# Altium integrated library Weidmueller_OMNIMATE_Power.IntLib: 508 symbols (part 8 of 9)
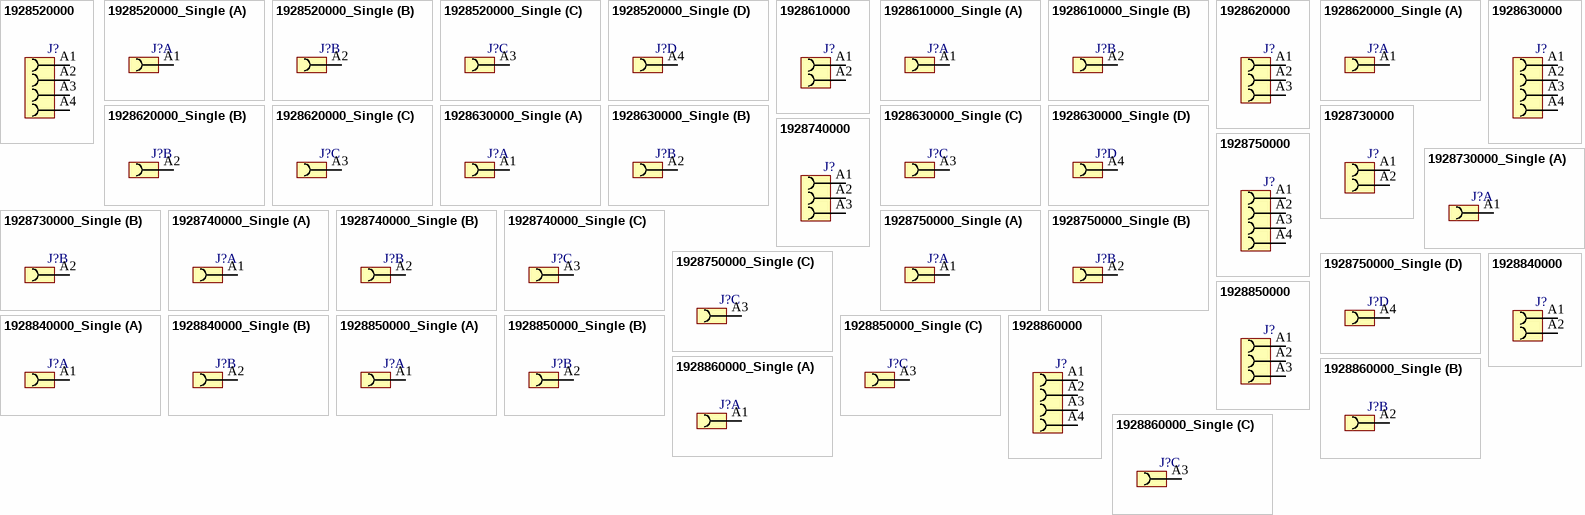
[diagram p38: symbols 1928520000 to 1928860000_Single]

## 1928740000_Single
designator J?
OMNIMATE Power - series BV/SV 7.62HP; PartNumber: 1928740000; Manufacturer: Weidmueller; Short_text_for_material: BVL 7.62HP/03/180FI 3.5SN BK BX; Side_termination_characteristic: Clip-on flange, inverted; Mounting_onto_the_PCB: Solder connection; Pitch_mm: 7.62 mm; Pitch_inch: 0.3 inch; No_of_poles: 3; Outgoing_elbow: 180°; Solder_pin_length_mm: 3.5 mm; Contact_material: Cu-Leg; Contact_surface: tinned; Insulating_material: PA GF; UL_94_flammability_rating: V-0; Rated_voltage_for_surge_voltage_class_pollution_degree_II_2: 1000 V; Rated_voltage_use_group_B_UL_1059: 300 V; Rated_current_use_group_B_UL_1059: 35 A; PackageReference: BVL_7_62HP_180FI_03; Colour: Black; Packaging: Box; Qty: 100 PCS; Revision: V1; ComponentLink1Description: Manufacturer URL; ComponentLink1URL: http://www.weidmueller.com/; ComponentLink2Description: URL Link1; ComponentLink2URL: http://catalog.weidmueller.com/catalog/Start.do?localeId=en&ObjectID=1928740000
footprint BVL_7_62HP_180FI_03 (OMNIMATE Power - Serie BV/SV 7.62HP  BVL 7.62HP/03/180FI 3.5)
part A pins: A1
part B pins: A2
part C pins: A3

## 1928750000
designator J?
OMNIMATE Power - series BV/SV 7.62HP; PartNumber: 1928750000; Manufacturer: Weidmueller; Short_text_for_material: BVL 7.62HP/04/180FI 3.5SN BK BX; Side_termination_characteristic: Clip-on flange, inverted; Mounting_onto_the_PCB: Solder connection; Pitch_mm: 7.62 mm; Pitch_inch: 0.3 inch; No_of_poles: 4; Outgoing_elbow: 180°; Solder_pin_length_mm: 3.5 mm; Contact_material: Cu-Leg; Contact_surface: tinned; Insulating_material: PA GF; UL_94_flammability_rating: V-0; Rated_voltage_for_surge_voltage_class_pollution_degree_II_2: 1000 V; Rated_voltage_use_group_B_UL_1059: 300 V; Rated_current_use_group_B_UL_1059: 35 A; PackageReference: BVL_7_62HP_180FI_04; Colour: Black; Packaging: Box; Qty: 100 PCS; Revision: V1; ComponentLink1Description: Manufacturer URL; ComponentLink1URL: http://www.weidmueller.com/; ComponentLink2Description: URL Link1; ComponentLink2URL: http://catalog.weidmueller.com/catalog/Start.do?localeId=en&ObjectID=1928750000
footprint BVL_7_62HP_180FI_04 (OMNIMATE Power - Serie BV/SV 7.62HP  BVL 7.62HP/04/180FI 3.5)
pins: A1, A2, A3, A4

## 1928750000_Single
designator J?
OMNIMATE Power - series BV/SV 7.62HP; PartNumber: 1928750000; Manufacturer: Weidmueller; Short_text_for_material: BVL 7.62HP/04/180FI 3.5SN BK BX; Side_termination_characteristic: Clip-on flange, inverted; Mounting_onto_the_PCB: Solder connection; Pitch_mm: 7.62 mm; Pitch_inch: 0.3 inch; No_of_poles: 4; Outgoing_elbow: 180°; Solder_pin_length_mm: 3.5 mm; Contact_material: Cu-Leg; Contact_surface: tinned; Insulating_material: PA GF; UL_94_flammability_rating: V-0; Rated_voltage_for_surge_voltage_class_pollution_degree_II_2: 1000 V; Rated_voltage_use_group_B_UL_1059: 300 V; Rated_current_use_group_B_UL_1059: 35 A; PackageReference: BVL_7_62HP_180FI_04; Colour: Black; Packaging: Box; Qty: 100 PCS; Revision: V1; ComponentLink1Description: Manufacturer URL; ComponentLink1URL: http://www.weidmueller.com/; ComponentLink2Description: URL Link1; ComponentLink2URL: http://catalog.weidmueller.com/catalog/Start.do?localeId=en&ObjectID=1928750000
footprint BVL_7_62HP_180FI_04 (OMNIMATE Power - Serie BV/SV 7.62HP  BVL 7.62HP/04/180FI 3.5)
part A pins: A1
part B pins: A2
part C pins: A3
part D pins: A4

## 1928840000
designator J?
OMNIMATE Power - series BV/SV 7.62HP; PartNumber: 1928840000; Manufacturer: Weidmueller; Short_text_for_material: BVL 7.62HP/02/180SFI 3.5SN BK BX; Side_termination_characteristic: Screw/clip-on flange, reversed; Mounting_onto_the_PCB: Solder connection; Pitch_mm: 7.62 mm; Pitch_inch: 0.3 inch; No_of_poles: 2; Outgoing_elbow: 180°; Solder_pin_length_mm: 3.5 mm; Contact_material: Cu-Leg; Contact_surface: tinned; Insulating_material: PA GF; UL_94_flammability_rating: V-0; Rated_voltage_for_surge_voltage_class_pollution_degree_II_2: 1000 V; Rated_voltage_use_group_B_UL_1059: 300 V; Rated_current_use_group_B_UL_1059: 35 A; PackageReference: BVL_7_62HP_180SFI_02; Colour: Black; Packaging: Box; Qty: 100 PCS; Revision: V1; ComponentLink1Description: Manufacturer URL; ComponentLink1URL: http://www.weidmueller.com/; ComponentLink2Description: URL Link1; ComponentLink2URL: http://catalog.weidmueller.com/catalog/Start.do?localeId=en&ObjectID=1928840000
footprint BVL_7_62HP_180SFI_02 (OMNIMATE Power - Serie BV/SV 7.62HP  BVL 7.62HP/02/180SFI 3.5)
pins: A1, A2

## 1928840000_Single
designator J?
OMNIMATE Power - series BV/SV 7.62HP; PartNumber: 1928840000; Manufacturer: Weidmueller; Short_text_for_material: BVL 7.62HP/02/180SFI 3.5SN BK BX; Side_termination_characteristic: Screw/clip-on flange, reversed; Mounting_onto_the_PCB: Solder connection; Pitch_mm: 7.62 mm; Pitch_inch: 0.3 inch; No_of_poles: 2; Outgoing_elbow: 180°; Solder_pin_length_mm: 3.5 mm; Contact_material: Cu-Leg; Contact_surface: tinned; Insulating_material: PA GF; UL_94_flammability_rating: V-0; Rated_voltage_for_surge_voltage_class_pollution_degree_II_2: 1000 V; Rated_voltage_use_group_B_UL_1059: 300 V; Rated_current_use_group_B_UL_1059: 35 A; PackageReference: BVL_7_62HP_180SFI_02; Colour: Black; Packaging: Box; Qty: 100 PCS; Revision: V1; ComponentLink1Description: Manufacturer URL; ComponentLink1URL: http://www.weidmueller.com/; ComponentLink2Description: URL Link1; ComponentLink2URL: http://catalog.weidmueller.com/catalog/Start.do?localeId=en&ObjectID=1928840000
footprint BVL_7_62HP_180SFI_02 (OMNIMATE Power - Serie BV/SV 7.62HP  BVL 7.62HP/02/180SFI 3.5)
part A pins: A1
part B pins: A2

## 1928850000
designator J?
OMNIMATE Power - series BV/SV 7.62HP; PartNumber: 1928850000; Manufacturer: Weidmueller; Short_text_for_material: BVL 7.62HP/03/180SFI 3.5SN BK BX; Side_termination_characteristic: Screw/clip-on flange, reversed; Mounting_onto_the_PCB: Solder connection; Pitch_mm: 7.62 mm; Pitch_inch: 0.3 inch; No_of_poles: 3; Outgoing_elbow: 180°; Solder_pin_length_mm: 3.5 mm; Contact_material: Cu-Leg; Contact_surface: tinned; Insulating_material: PA GF; UL_94_flammability_rating: V-0; Rated_voltage_for_surge_voltage_class_pollution_degree_II_2: 1000 V; Rated_voltage_use_group_B_UL_1059: 300 V; Rated_current_use_group_B_UL_1059: 35 A; PackageReference: BVL_7_62HP_180SFI_03; Colour: Black; Packaging: Box; Qty: 100 PCS; Revision: V1; ComponentLink1Description: Manufacturer URL; ComponentLink1URL: http://www.weidmueller.com/; ComponentLink2Description: URL Link1; ComponentLink2URL: http://catalog.weidmueller.com/catalog/Start.do?localeId=en&ObjectID=1928850000
footprint BVL_7_62HP_180SFI_03 (OMNIMATE Power - Serie BV/SV 7.62HP  BVL 7.62HP/03/180SFI 3.5)
pins: A1, A2, A3

## 1928850000_Single
designator J?
OMNIMATE Power - series BV/SV 7.62HP; PartNumber: 1928850000; Manufacturer: Weidmueller; Short_text_for_material: BVL 7.62HP/03/180SFI 3.5SN BK BX; Side_termination_characteristic: Screw/clip-on flange, reversed; Mounting_onto_the_PCB: Solder connection; Pitch_mm: 7.62 mm; Pitch_inch: 0.3 inch; No_of_poles: 3; Outgoing_elbow: 180°; Solder_pin_length_mm: 3.5 mm; Contact_material: Cu-Leg; Contact_surface: tinned; Insulating_material: PA GF; UL_94_flammability_rating: V-0; Rated_voltage_for_surge_voltage_class_pollution_degree_II_2: 1000 V; Rated_voltage_use_group_B_UL_1059: 300 V; Rated_current_use_group_B_UL_1059: 35 A; PackageReference: BVL_7_62HP_180SFI_03; Colour: Black; Packaging: Box; Qty: 100 PCS; Revision: V1; ComponentLink1Description: Manufacturer URL; ComponentLink1URL: http://www.weidmueller.com/; ComponentLink2Description: URL Link1; ComponentLink2URL: http://catalog.weidmueller.com/catalog/Start.do?localeId=en&ObjectID=1928850000
footprint BVL_7_62HP_180SFI_03 (OMNIMATE Power - Serie BV/SV 7.62HP  BVL 7.62HP/03/180SFI 3.5)
part A pins: A1
part B pins: A2
part C pins: A3

## 1928860000
designator J?
OMNIMATE Power - series BV/SV 7.62HP; PartNumber: 1928860000; Manufacturer: Weidmueller; Short_text_for_material: BVL 7.62HP/04/180SFI 3.5SN BK BX; Side_termination_characteristic: Screw/clip-on flange, reversed; Mounting_onto_the_PCB: Solder connection; Pitch_mm: 7.62 mm; Pitch_inch: 0.3 inch; No_of_poles: 4; Outgoing_elbow: 180°; Solder_pin_length_mm: 3.5 mm; Contact_material: Cu-Leg; Contact_surface: tinned; Insulating_material: PA GF; UL_94_flammability_rating: V-0; Rated_voltage_for_surge_voltage_class_pollution_degree_II_2: 1000 V; Rated_voltage_use_group_B_UL_1059: 300 V; Rated_current_use_group_B_UL_1059: 35 A; PackageReference: BVL_7_62HP_180SFI_04; Colour: Black; Packaging: Box; Qty: 100 PCS; Revision: V1; ComponentLink1Description: Manufacturer URL; ComponentLink1URL: http://www.weidmueller.com/; ComponentLink2Description: URL Link1; ComponentLink2URL: http://catalog.weidmueller.com/catalog/Start.do?localeId=en&ObjectID=1928860000
footprint BVL_7_62HP_180SFI_04 (OMNIMATE Power - Serie BV/SV 7.62HP  BVL 7.62HP/04/180SFI 3.5)
pins: A1, A2, A3, A4

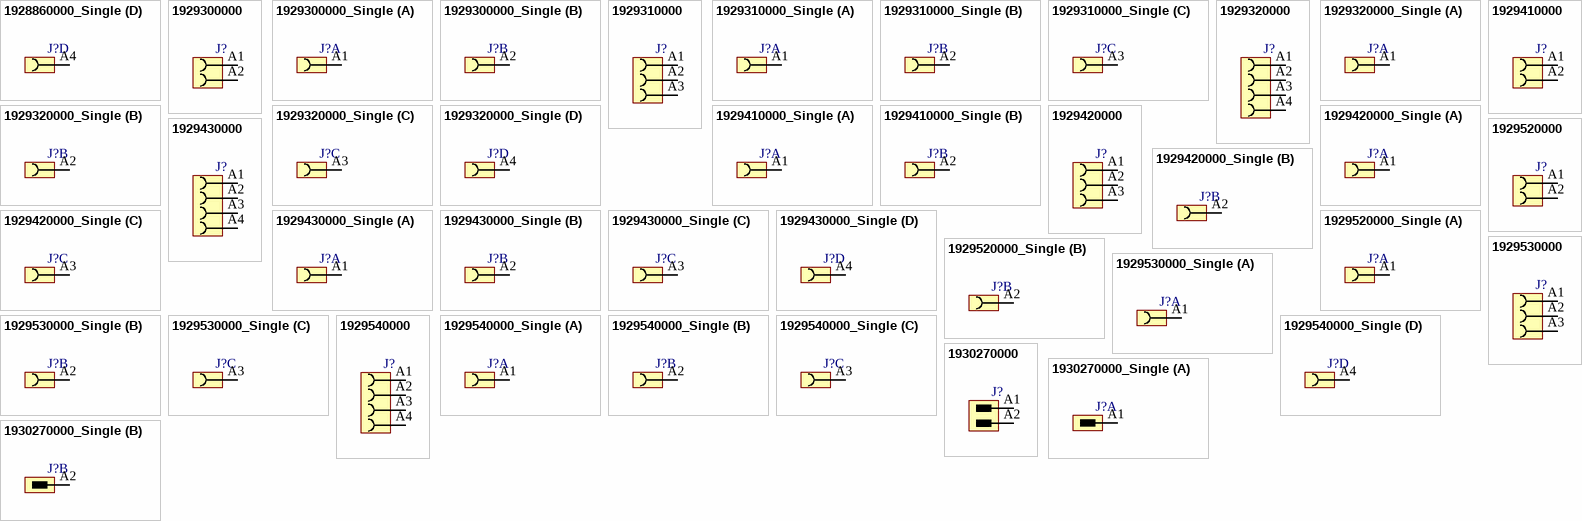
[diagram p27: symbols 1928860000_Single to 1930270000_Single]

## 1928860000_Single
designator J?
OMNIMATE Power - series BV/SV 7.62HP; PartNumber: 1928860000; Manufacturer: Weidmueller; Short_text_for_material: BVL 7.62HP/04/180SFI 3.5SN BK BX; Side_termination_characteristic: Screw/clip-on flange, reversed; Mounting_onto_the_PCB: Solder connection; Pitch_mm: 7.62 mm; Pitch_inch: 0.3 inch; No_of_poles: 4; Outgoing_elbow: 180°; Solder_pin_length_mm: 3.5 mm; Contact_material: Cu-Leg; Contact_surface: tinned; Insulating_material: PA GF; UL_94_flammability_rating: V-0; Rated_voltage_for_surge_voltage_class_pollution_degree_II_2: 1000 V; Rated_voltage_use_group_B_UL_1059: 300 V; Rated_current_use_group_B_UL_1059: 35 A; PackageReference: BVL_7_62HP_180SFI_04; Colour: Black; Packaging: Box; Qty: 100 PCS; Revision: V1; ComponentLink1Description: Manufacturer URL; ComponentLink1URL: http://www.weidmueller.com/; ComponentLink2Description: URL Link1; ComponentLink2URL: http://catalog.weidmueller.com/catalog/Start.do?localeId=en&ObjectID=1928860000
footprint BVL_7_62HP_180SFI_04 (OMNIMATE Power - Serie BV/SV 7.62HP  BVL 7.62HP/04/180SFI 3.5)
part A pins: A1
part B pins: A2
part C pins: A3
part D pins: A4

## 1929300000
designator J?
OMNIMATE Power - series BV/SV 7.62HP; PartNumber: 1929300000; Manufacturer: Weidmueller; Short_text_for_material: BVL 7.62HP/02/270 3.5SN BK BX; Side_termination_characteristic: closed side; Mounting_onto_the_PCB: Solder connection; Pitch_mm: 7.62 mm; Pitch_inch: 0.3 inch; No_of_poles: 2; Outgoing_elbow: 270°; Solder_pin_length_mm: 3.5 mm; Contact_material: Cu-Leg; Contact_surface: tinned; Insulating_material: PA GF; UL_94_flammability_rating: V-0; Rated_voltage_for_surge_voltage_class_pollution_degree_II_2: 1000 V; Rated_voltage_use_group_B_UL_1059: 300 V; Rated_current_use_group_B_UL_1059: 35 A; PackageReference: BVL_7_62HP_270_02; Colour: Black; Packaging: Box; Qty: 100 PCS; Revision: V1; ComponentLink1Description: Manufacturer URL; ComponentLink1URL: http://www.weidmueller.com/; ComponentLink2Description: URL Link1; ComponentLink2URL: http://catalog.weidmueller.com/catalog/Start.do?localeId=en&ObjectID=1929300000
footprint BVL_7_62HP_270_02 (OMNIMATE Power - Serie BV/SV 7.62HP  BVL 7.62HP/02/270 3.5)
pins: A1, A2

## 1929300000_Single
designator J?
OMNIMATE Power - series BV/SV 7.62HP; PartNumber: 1929300000; Manufacturer: Weidmueller; Short_text_for_material: BVL 7.62HP/02/270 3.5SN BK BX; Side_termination_characteristic: closed side; Mounting_onto_the_PCB: Solder connection; Pitch_mm: 7.62 mm; Pitch_inch: 0.3 inch; No_of_poles: 2; Outgoing_elbow: 270°; Solder_pin_length_mm: 3.5 mm; Contact_material: Cu-Leg; Contact_surface: tinned; Insulating_material: PA GF; UL_94_flammability_rating: V-0; Rated_voltage_for_surge_voltage_class_pollution_degree_II_2: 1000 V; Rated_voltage_use_group_B_UL_1059: 300 V; Rated_current_use_group_B_UL_1059: 35 A; PackageReference: BVL_7_62HP_270_02; Colour: Black; Packaging: Box; Qty: 100 PCS; Revision: V1; ComponentLink1Description: Manufacturer URL; ComponentLink1URL: http://www.weidmueller.com/; ComponentLink2Description: URL Link1; ComponentLink2URL: http://catalog.weidmueller.com/catalog/Start.do?localeId=en&ObjectID=1929300000
footprint BVL_7_62HP_270_02 (OMNIMATE Power - Serie BV/SV 7.62HP  BVL 7.62HP/02/270 3.5)
part A pins: A1
part B pins: A2

## 1929310000
designator J?
OMNIMATE Power - series BV/SV 7.62HP; PartNumber: 1929310000; Manufacturer: Weidmueller; Short_text_for_material: BVL 7.62HP/03/270 3.5SN BK BX; Side_termination_characteristic: closed side; Mounting_onto_the_PCB: Solder connection; Pitch_mm: 7.62 mm; Pitch_inch: 0.3 inch; No_of_poles: 3; Outgoing_elbow: 270°; Solder_pin_length_mm: 3.5 mm; Contact_material: Cu-Leg; Contact_surface: tinned; Insulating_material: PA GF; UL_94_flammability_rating: V-0; Rated_voltage_for_surge_voltage_class_pollution_degree_II_2: 1000 V; Rated_voltage_use_group_B_UL_1059: 300 V; Rated_current_use_group_B_UL_1059: 35 A; PackageReference: BVL_7_62HP_270_03; Colour: Black; Packaging: Box; Qty: 100 PCS; Revision: V1; ComponentLink1Description: Manufacturer URL; ComponentLink1URL: http://www.weidmueller.com/; ComponentLink2Description: URL Link1; ComponentLink2URL: http://catalog.weidmueller.com/catalog/Start.do?localeId=en&ObjectID=1929310000
footprint BVL_7_62HP_270_03 (OMNIMATE Power - Serie BV/SV 7.62HP  BVL 7.62HP/03/270 3.5)
pins: A1, A2, A3

## 1929310000_Single
designator J?
OMNIMATE Power - series BV/SV 7.62HP; PartNumber: 1929310000; Manufacturer: Weidmueller; Short_text_for_material: BVL 7.62HP/03/270 3.5SN BK BX; Side_termination_characteristic: closed side; Mounting_onto_the_PCB: Solder connection; Pitch_mm: 7.62 mm; Pitch_inch: 0.3 inch; No_of_poles: 3; Outgoing_elbow: 270°; Solder_pin_length_mm: 3.5 mm; Contact_material: Cu-Leg; Contact_surface: tinned; Insulating_material: PA GF; UL_94_flammability_rating: V-0; Rated_voltage_for_surge_voltage_class_pollution_degree_II_2: 1000 V; Rated_voltage_use_group_B_UL_1059: 300 V; Rated_current_use_group_B_UL_1059: 35 A; PackageReference: BVL_7_62HP_270_03; Colour: Black; Packaging: Box; Qty: 100 PCS; Revision: V1; ComponentLink1Description: Manufacturer URL; ComponentLink1URL: http://www.weidmueller.com/; ComponentLink2Description: URL Link1; ComponentLink2URL: http://catalog.weidmueller.com/catalog/Start.do?localeId=en&ObjectID=1929310000
footprint BVL_7_62HP_270_03 (OMNIMATE Power - Serie BV/SV 7.62HP  BVL 7.62HP/03/270 3.5)
part A pins: A1
part B pins: A2
part C pins: A3

## 1929320000
designator J?
OMNIMATE Power - series BV/SV 7.62HP; PartNumber: 1929320000; Manufacturer: Weidmueller; Short_text_for_material: BVL 7.62HP/04/270 3.5SN BK BX; Side_termination_characteristic: closed side; Mounting_onto_the_PCB: Solder connection; Pitch_mm: 7.62 mm; Pitch_inch: 0.3 inch; No_of_poles: 4; Outgoing_elbow: 270°; Solder_pin_length_mm: 3.5 mm; Contact_material: Cu-Leg; Contact_surface: tinned; Insulating_material: PA GF; UL_94_flammability_rating: V-0; Rated_voltage_for_surge_voltage_class_pollution_degree_II_2: 1000 V; Rated_voltage_use_group_B_UL_1059: 300 V; Rated_current_use_group_B_UL_1059: 35 A; PackageReference: BVL_7_62HP_270_04; Colour: Black; Packaging: Box; Qty: 100 PCS; Revision: V1; ComponentLink1Description: Manufacturer URL; ComponentLink1URL: http://www.weidmueller.com/; ComponentLink2Description: URL Link1; ComponentLink2URL: http://catalog.weidmueller.com/catalog/Start.do?localeId=en&ObjectID=1929320000
footprint BVL_7_62HP_270_04 (OMNIMATE Power - Serie BV/SV 7.62HP  BVL 7.62HP/04/270 3.5)
pins: A1, A2, A3, A4

## 1929320000_Single
designator J?
OMNIMATE Power - series BV/SV 7.62HP; PartNumber: 1929320000; Manufacturer: Weidmueller; Short_text_for_material: BVL 7.62HP/04/270 3.5SN BK BX; Side_termination_characteristic: closed side; Mounting_onto_the_PCB: Solder connection; Pitch_mm: 7.62 mm; Pitch_inch: 0.3 inch; No_of_poles: 4; Outgoing_elbow: 270°; Solder_pin_length_mm: 3.5 mm; Contact_material: Cu-Leg; Contact_surface: tinned; Insulating_material: PA GF; UL_94_flammability_rating: V-0; Rated_voltage_for_surge_voltage_class_pollution_degree_II_2: 1000 V; Rated_voltage_use_group_B_UL_1059: 300 V; Rated_current_use_group_B_UL_1059: 35 A; PackageReference: BVL_7_62HP_270_04; Colour: Black; Packaging: Box; Qty: 100 PCS; Revision: V1; ComponentLink1Description: Manufacturer URL; ComponentLink1URL: http://www.weidmueller.com/; ComponentLink2Description: URL Link1; ComponentLink2URL: http://catalog.weidmueller.com/catalog/Start.do?localeId=en&ObjectID=1929320000
footprint BVL_7_62HP_270_04 (OMNIMATE Power - Serie BV/SV 7.62HP  BVL 7.62HP/04/270 3.5)
part A pins: A1
part B pins: A2
part C pins: A3
part D pins: A4

## 1929410000
designator J?
OMNIMATE Power - series BV/SV 7.62HP; PartNumber: 1929410000; Manufacturer: Weidmueller; Short_text_for_material: BVL 7.62HP/02/270FI 3.5SN BK BX; Side_termination_characteristic: Clip-on flange, inverted; Mounting_onto_the_PCB: Solder connection; Pitch_mm: 7.62 mm; Pitch_inch: 0.3 inch; No_of_poles: 2; Outgoing_elbow: 270°; Solder_pin_length_mm: 3.5 mm; Contact_material: Cu-Leg; Contact_surface: tinned; Insulating_material: PA GF; UL_94_flammability_rating: V-0; Rated_voltage_for_surge_voltage_class_pollution_degree_II_2: 1000 V; Rated_voltage_use_group_B_UL_1059: 300 V; Rated_current_use_group_B_UL_1059: 35 A; PackageReference: BVL_7_62HP_270FI_02; Colour: Black; Packaging: Box; Qty: 100 PCS; Revision: V1; ComponentLink1Description: Manufacturer URL; ComponentLink1URL: http://www.weidmueller.com/; ComponentLink2Description: URL Link1; ComponentLink2URL: http://catalog.weidmueller.com/catalog/Start.do?localeId=en&ObjectID=1929410000
footprint BVL_7_62HP_270FI_02 (OMNIMATE Power - Serie BV/SV 7.62HP  BVL 7.62HP/02/270FI 3.5)
pins: A1, A2

## 1929410000_Single
designator J?
OMNIMATE Power - series BV/SV 7.62HP; PartNumber: 1929410000; Manufacturer: Weidmueller; Short_text_for_material: BVL 7.62HP/02/270FI 3.5SN BK BX; Side_termination_characteristic: Clip-on flange, inverted; Mounting_onto_the_PCB: Solder connection; Pitch_mm: 7.62 mm; Pitch_inch: 0.3 inch; No_of_poles: 2; Outgoing_elbow: 270°; Solder_pin_length_mm: 3.5 mm; Contact_material: Cu-Leg; Contact_surface: tinned; Insulating_material: PA GF; UL_94_flammability_rating: V-0; Rated_voltage_for_surge_voltage_class_pollution_degree_II_2: 1000 V; Rated_voltage_use_group_B_UL_1059: 300 V; Rated_current_use_group_B_UL_1059: 35 A; PackageReference: BVL_7_62HP_270FI_02; Colour: Black; Packaging: Box; Qty: 100 PCS; Revision: V1; ComponentLink1Description: Manufacturer URL; ComponentLink1URL: http://www.weidmueller.com/; ComponentLink2Description: URL Link1; ComponentLink2URL: http://catalog.weidmueller.com/catalog/Start.do?localeId=en&ObjectID=1929410000
footprint BVL_7_62HP_270FI_02 (OMNIMATE Power - Serie BV/SV 7.62HP  BVL 7.62HP/02/270FI 3.5)
part A pins: A1
part B pins: A2

## 1929420000
designator J?
OMNIMATE Power - series BV/SV 7.62HP; PartNumber: 1929420000; Manufacturer: Weidmueller; Short_text_for_material: BVL 7.62HP/03/270FI 3.5SN BK BX; Side_termination_characteristic: Clip-on flange, inverted; Mounting_onto_the_PCB: Solder connection; Pitch_mm: 7.62 mm; Pitch_inch: 0.3 inch; No_of_poles: 3; Outgoing_elbow: 270°; Solder_pin_length_mm: 3.5 mm; Contact_material: Cu-Leg; Contact_surface: tinned; Insulating_material: PA GF; UL_94_flammability_rating: V-0; Rated_voltage_for_surge_voltage_class_pollution_degree_II_2: 1000 V; Rated_voltage_use_group_B_UL_1059: 300 V; Rated_current_use_group_B_UL_1059: 35 A; PackageReference: BVL_7_62HP_270FI_03; Colour: Black; Packaging: Box; Qty: 100 PCS; Revision: V1; ComponentLink1Description: Manufacturer URL; ComponentLink1URL: http://www.weidmueller.com/; ComponentLink2Description: URL Link1; ComponentLink2URL: http://catalog.weidmueller.com/catalog/Start.do?localeId=en&ObjectID=1929420000
footprint BVL_7_62HP_270FI_03 (OMNIMATE Power - Serie BV/SV 7.62HP  BVL 7.62HP/03/270FI 3.5)
pins: A1, A2, A3

## 1929420000_Single
designator J?
OMNIMATE Power - series BV/SV 7.62HP; PartNumber: 1929420000; Manufacturer: Weidmueller; Short_text_for_material: BVL 7.62HP/03/270FI 3.5SN BK BX; Side_termination_characteristic: Clip-on flange, inverted; Mounting_onto_the_PCB: Solder connection; Pitch_mm: 7.62 mm; Pitch_inch: 0.3 inch; No_of_poles: 3; Outgoing_elbow: 270°; Solder_pin_length_mm: 3.5 mm; Contact_material: Cu-Leg; Contact_surface: tinned; Insulating_material: PA GF; UL_94_flammability_rating: V-0; Rated_voltage_for_surge_voltage_class_pollution_degree_II_2: 1000 V; Rated_voltage_use_group_B_UL_1059: 300 V; Rated_current_use_group_B_UL_1059: 35 A; PackageReference: BVL_7_62HP_270FI_03; Colour: Black; Packaging: Box; Qty: 100 PCS; Revision: V1; ComponentLink1Description: Manufacturer URL; ComponentLink1URL: http://www.weidmueller.com/; ComponentLink2Description: URL Link1; ComponentLink2URL: http://catalog.weidmueller.com/catalog/Start.do?localeId=en&ObjectID=1929420000
footprint BVL_7_62HP_270FI_03 (OMNIMATE Power - Serie BV/SV 7.62HP  BVL 7.62HP/03/270FI 3.5)
part A pins: A1
part B pins: A2
part C pins: A3

## 1929430000
designator J?
OMNIMATE Power - series BV/SV 7.62HP; PartNumber: 1929430000; Manufacturer: Weidmueller; Short_text_for_material: BVL 7.62HP/04/270FI 3.5SN BK BX; Side_termination_characteristic: Clip-on flange, inverted; Mounting_onto_the_PCB: Solder connection; Pitch_mm: 7.62 mm; Pitch_inch: 0.3 inch; No_of_poles: 4; Outgoing_elbow: 270°; Solder_pin_length_mm: 3.5 mm; Contact_material: Cu-Leg; Contact_surface: tinned; Insulating_material: PA GF; UL_94_flammability_rating: V-0; Rated_voltage_for_surge_voltage_class_pollution_degree_II_2: 1000 V; Rated_voltage_use_group_B_UL_1059: 300 V; Rated_current_use_group_B_UL_1059: 35 A; PackageReference: BVL_7_62HP_270FI_04; Colour: Black; Packaging: Box; Qty: 100 PCS; Revision: V1; ComponentLink1Description: Manufacturer URL; ComponentLink1URL: http://www.weidmueller.com/; ComponentLink2Description: URL Link1; ComponentLink2URL: http://catalog.weidmueller.com/catalog/Start.do?localeId=en&ObjectID=1929430000
footprint BVL_7_62HP_270FI_04 (OMNIMATE Power - Serie BV/SV 7.62HP  BVL 7.62HP/04/270FI 3.5)
pins: A1, A2, A3, A4

## 1929430000_Single
designator J?
OMNIMATE Power - series BV/SV 7.62HP; PartNumber: 1929430000; Manufacturer: Weidmueller; Short_text_for_material: BVL 7.62HP/04/270FI 3.5SN BK BX; Side_termination_characteristic: Clip-on flange, inverted; Mounting_onto_the_PCB: Solder connection; Pitch_mm: 7.62 mm; Pitch_inch: 0.3 inch; No_of_poles: 4; Outgoing_elbow: 270°; Solder_pin_length_mm: 3.5 mm; Contact_material: Cu-Leg; Contact_surface: tinned; Insulating_material: PA GF; UL_94_flammability_rating: V-0; Rated_voltage_for_surge_voltage_class_pollution_degree_II_2: 1000 V; Rated_voltage_use_group_B_UL_1059: 300 V; Rated_current_use_group_B_UL_1059: 35 A; PackageReference: BVL_7_62HP_270FI_04; Colour: Black; Packaging: Box; Qty: 100 PCS; Revision: V1; ComponentLink1Description: Manufacturer URL; ComponentLink1URL: http://www.weidmueller.com/; ComponentLink2Description: URL Link1; ComponentLink2URL: http://catalog.weidmueller.com/catalog/Start.do?localeId=en&ObjectID=1929430000
footprint BVL_7_62HP_270FI_04 (OMNIMATE Power - Serie BV/SV 7.62HP  BVL 7.62HP/04/270FI 3.5)
part A pins: A1
part B pins: A2
part C pins: A3
part D pins: A4

## 1929520000
designator J?
OMNIMATE Power - series BV/SV 7.62HP; PartNumber: 1929520000; Manufacturer: Weidmueller; Short_text_for_material: BVL 7.62HP/02/270SFI 3.5SN BK BX; Side_termination_characteristic: Screw/clip-on flange, reversed; Mounting_onto_the_PCB: Solder connection; Pitch_mm: 7.62 mm; Pitch_inch: 0.3 inch; No_of_poles: 2; Outgoing_elbow: 270°; Solder_pin_length_mm: 3.5 mm; Contact_material: Cu-Leg; Contact_surface: tinned; Insulating_material: PA GF; UL_94_flammability_rating: V-0; Rated_voltage_for_surge_voltage_class_pollution_degree_II_2: 1000 V; Rated_voltage_use_group_B_UL_1059: 300 V; Rated_current_use_group_B_UL_1059: 35 A; PackageReference: BVL_7_62HP_270SFI_02; Colour: Black; Packaging: Box; Qty: 100 PCS; Revision: V1; ComponentLink1Description: Manufacturer URL; ComponentLink1URL: http://www.weidmueller.com/; ComponentLink2Description: URL Link1; ComponentLink2URL: http://catalog.weidmueller.com/catalog/Start.do?localeId=en&ObjectID=1929520000
footprint BVL_7_62HP_270SFI_02 (OMNIMATE Power - Serie BV/SV 7.62HP  BVL 7.62HP/02/270SFI 3.5)
pins: A1, A2

## 1929520000_Single
designator J?
OMNIMATE Power - series BV/SV 7.62HP; PartNumber: 1929520000; Manufacturer: Weidmueller; Short_text_for_material: BVL 7.62HP/02/270SFI 3.5SN BK BX; Side_termination_characteristic: Screw/clip-on flange, reversed; Mounting_onto_the_PCB: Solder connection; Pitch_mm: 7.62 mm; Pitch_inch: 0.3 inch; No_of_poles: 2; Outgoing_elbow: 270°; Solder_pin_length_mm: 3.5 mm; Contact_material: Cu-Leg; Contact_surface: tinned; Insulating_material: PA GF; UL_94_flammability_rating: V-0; Rated_voltage_for_surge_voltage_class_pollution_degree_II_2: 1000 V; Rated_voltage_use_group_B_UL_1059: 300 V; Rated_current_use_group_B_UL_1059: 35 A; PackageReference: BVL_7_62HP_270SFI_02; Colour: Black; Packaging: Box; Qty: 100 PCS; Revision: V1; ComponentLink1Description: Manufacturer URL; ComponentLink1URL: http://www.weidmueller.com/; ComponentLink2Description: URL Link1; ComponentLink2URL: http://catalog.weidmueller.com/catalog/Start.do?localeId=en&ObjectID=1929520000
footprint BVL_7_62HP_270SFI_02 (OMNIMATE Power - Serie BV/SV 7.62HP  BVL 7.62HP/02/270SFI 3.5)
part A pins: A1
part B pins: A2

## 1929530000
designator J?
OMNIMATE Power - series BV/SV 7.62HP; PartNumber: 1929530000; Manufacturer: Weidmueller; Short_text_for_material: BVL 7.62HP/03/270SFI 3.5SN BK BX; Side_termination_characteristic: Screw/clip-on flange, reversed; Mounting_onto_the_PCB: Solder connection; Pitch_mm: 7.62 mm; Pitch_inch: 0.3 inch; No_of_poles: 3; Outgoing_elbow: 270°; Solder_pin_length_mm: 3.5 mm; Contact_material: Cu-Leg; Contact_surface: tinned; Insulating_material: PA GF; UL_94_flammability_rating: V-0; Rated_voltage_for_surge_voltage_class_pollution_degree_II_2: 1000 V; Rated_voltage_use_group_B_UL_1059: 300 V; Rated_current_use_group_B_UL_1059: 35 A; PackageReference: BVL_7_62HP_270SFI_03; Colour: Black; Packaging: Box; Qty: 100 PCS; Revision: V1; ComponentLink1Description: Manufacturer URL; ComponentLink1URL: http://www.weidmueller.com/; ComponentLink2Description: URL Link1; ComponentLink2URL: http://catalog.weidmueller.com/catalog/Start.do?localeId=en&ObjectID=1929530000
footprint BVL_7_62HP_270SFI_03 (OMNIMATE Power - Serie BV/SV 7.62HP  BVL 7.62HP/03/270SFI 3.5)
pins: A1, A2, A3

## 1929530000_Single
designator J?
OMNIMATE Power - series BV/SV 7.62HP; PartNumber: 1929530000; Manufacturer: Weidmueller; Short_text_for_material: BVL 7.62HP/03/270SFI 3.5SN BK BX; Side_termination_characteristic: Screw/clip-on flange, reversed; Mounting_onto_the_PCB: Solder connection; Pitch_mm: 7.62 mm; Pitch_inch: 0.3 inch; No_of_poles: 3; Outgoing_elbow: 270°; Solder_pin_length_mm: 3.5 mm; Contact_material: Cu-Leg; Contact_surface: tinned; Insulating_material: PA GF; UL_94_flammability_rating: V-0; Rated_voltage_for_surge_voltage_class_pollution_degree_II_2: 1000 V; Rated_voltage_use_group_B_UL_1059: 300 V; Rated_current_use_group_B_UL_1059: 35 A; PackageReference: BVL_7_62HP_270SFI_03; Colour: Black; Packaging: Box; Qty: 100 PCS; Revision: V1; ComponentLink1Description: Manufacturer URL; ComponentLink1URL: http://www.weidmueller.com/; ComponentLink2Description: URL Link1; ComponentLink2URL: http://catalog.weidmueller.com/catalog/Start.do?localeId=en&ObjectID=1929530000
footprint BVL_7_62HP_270SFI_03 (OMNIMATE Power - Serie BV/SV 7.62HP  BVL 7.62HP/03/270SFI 3.5)
part A pins: A1
part B pins: A2
part C pins: A3

## 1929540000
designator J?
OMNIMATE Power - series BV/SV 7.62HP; PartNumber: 1929540000; Manufacturer: Weidmueller; Short_text_for_material: BVL 7.62HP/04/270SFI 3.5SN BK BX; Side_termination_characteristic: Screw/clip-on flange, reversed; Mounting_onto_the_PCB: Solder connection; Pitch_mm: 7.62 mm; Pitch_inch: 0.3 inch; No_of_poles: 4; Outgoing_elbow: 270°; Solder_pin_length_mm: 3.5 mm; Contact_material: Cu-Leg; Contact_surface: tinned; Insulating_material: PA GF; UL_94_flammability_rating: V-0; Rated_voltage_for_surge_voltage_class_pollution_degree_II_2: 1000 V; Rated_voltage_use_group_B_UL_1059: 300 V; Rated_current_use_group_B_UL_1059: 35 A; PackageReference: BVL_7_62HP_270SFI_04; Colour: Black; Packaging: Box; Qty: 100 PCS; Revision: V1; ComponentLink1Description: Manufacturer URL; ComponentLink1URL: http://www.weidmueller.com/; ComponentLink2Description: URL Link1; ComponentLink2URL: http://catalog.weidmueller.com/catalog/Start.do?localeId=en&ObjectID=1929540000
footprint BVL_7_62HP_270SFI_04 (OMNIMATE Power - Serie BV/SV 7.62HP  BVL 7.62HP/04/270SFI 3.5)
pins: A1, A2, A3, A4

## 1929540000_Single
designator J?
OMNIMATE Power - series BV/SV 7.62HP; PartNumber: 1929540000; Manufacturer: Weidmueller; Short_text_for_material: BVL 7.62HP/04/270SFI 3.5SN BK BX; Side_termination_characteristic: Screw/clip-on flange, reversed; Mounting_onto_the_PCB: Solder connection; Pitch_mm: 7.62 mm; Pitch_inch: 0.3 inch; No_of_poles: 4; Outgoing_elbow: 270°; Solder_pin_length_mm: 3.5 mm; Contact_material: Cu-Leg; Contact_surface: tinned; Insulating_material: PA GF; UL_94_flammability_rating: V-0; Rated_voltage_for_surge_voltage_class_pollution_degree_II_2: 1000 V; Rated_voltage_use_group_B_UL_1059: 300 V; Rated_current_use_group_B_UL_1059: 35 A; PackageReference: BVL_7_62HP_270SFI_04; Colour: Black; Packaging: Box; Qty: 100 PCS; Revision: V1; ComponentLink1Description: Manufacturer URL; ComponentLink1URL: http://www.weidmueller.com/; ComponentLink2Description: URL Link1; ComponentLink2URL: http://catalog.weidmueller.com/catalog/Start.do?localeId=en&ObjectID=1929540000
footprint BVL_7_62HP_270SFI_04 (OMNIMATE Power - Serie BV/SV 7.62HP  BVL 7.62HP/04/270SFI 3.5)
part A pins: A1
part B pins: A2
part C pins: A3
part D pins: A4

## 1930270000
designator J?
OMNIMATE Power - series BV/SV 7.62HP; PartNumber: 1930270000; Manufacturer: Weidmueller; Short_text_for_material: SV 7.62HP/02/90G 3.5SN BK BX; Side_termination_characteristic: closed side; Mounting_onto_the_PCB: Solder connection; Pitch_mm: 7.62 mm; Pitch_inch: 0.3 inch; No_of_poles: 2; Outgoing_elbow: 90°; Solder_pin_length_mm: 3.5 mm; Contact_material: Cu-Leg; Contact_surface: tinned; Insulating_material: PA GF; UL_94_flammability_rating: V-0; Rated_voltage_for_surge_voltage_class_pollution_degree_II_2: 1000 V; Rated_voltage_use_group_B_UL_1059: 300 V; Rated_current_use_group_B_UL_1059: 40.5 A; PackageReference: SV_7_62HP_90G_02; Colour: Black; Packaging: Box; Qty: 120 PCS; Revision: V1; ComponentLink1Description: Manufacturer URL; ComponentLink1URL: http://www.weidmueller.com/; ComponentLink2Description: URL Link1; ComponentLink2URL: http://catalog.weidmueller.com/catalog/Start.do?localeId=en&ObjectID=1930270000
footprint SV_7_62HP_90G_02 (OMNIMATE Power - Serie BV/SV 7.62HP  SV 7.62HP/02/90G 3.5)
pins: A1, A2

## 1930270000_Single
designator J?
OMNIMATE Power - series BV/SV 7.62HP; PartNumber: 1930270000; Manufacturer: Weidmueller; Short_text_for_material: SV 7.62HP/02/90G 3.5SN BK BX; Side_termination_characteristic: closed side; Mounting_onto_the_PCB: Solder connection; Pitch_mm: 7.62 mm; Pitch_inch: 0.3 inch; No_of_poles: 2; Outgoing_elbow: 90°; Solder_pin_length_mm: 3.5 mm; Contact_material: Cu-Leg; Contact_surface: tinned; Insulating_material: PA GF; UL_94_flammability_rating: V-0; Rated_voltage_for_surge_voltage_class_pollution_degree_II_2: 1000 V; Rated_voltage_use_group_B_UL_1059: 300 V; Rated_current_use_group_B_UL_1059: 40.5 A; PackageReference: SV_7_62HP_90G_02; Colour: Black; Packaging: Box; Qty: 120 PCS; Revision: V1; ComponentLink1Description: Manufacturer URL; ComponentLink1URL: http://www.weidmueller.com/; ComponentLink2Description: URL Link1; ComponentLink2URL: http://catalog.weidmueller.com/catalog/Start.do?localeId=en&ObjectID=1930270000
footprint SV_7_62HP_90G_02 (OMNIMATE Power - Serie BV/SV 7.62HP  SV 7.62HP/02/90G 3.5)
part A pins: A1
part B pins: A2

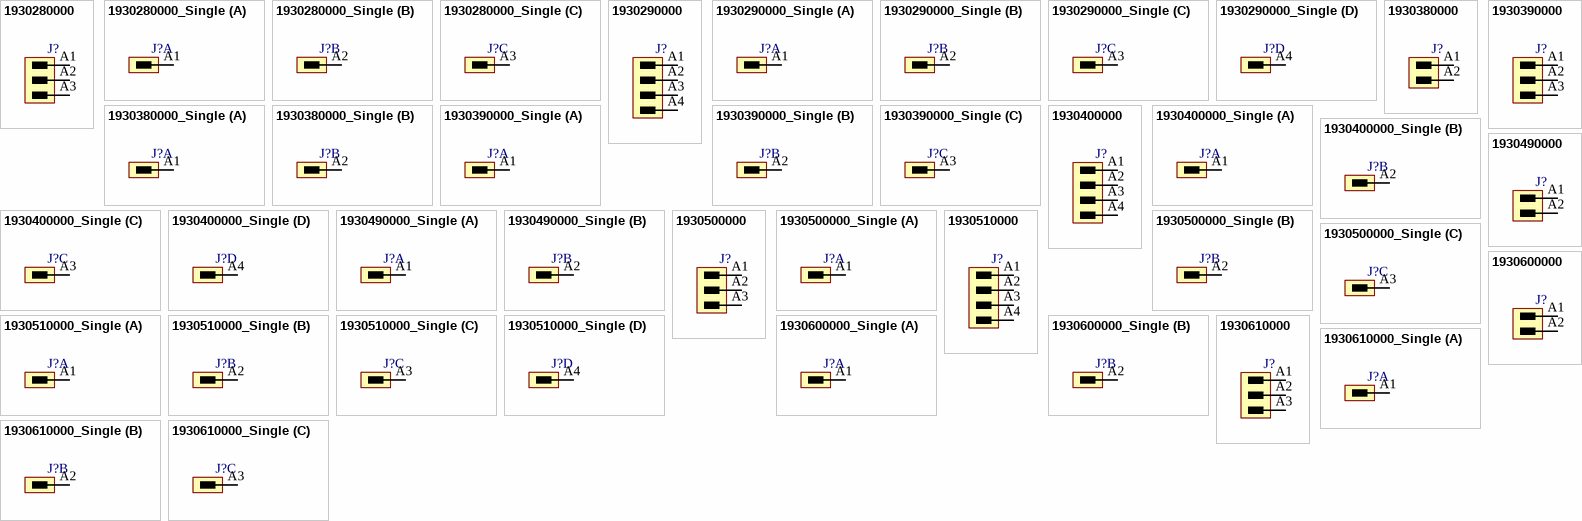
[diagram p28: symbols 1930280000 to 1930610000_Single]

## 1930280000
designator J?